# Altium footprint library main.PcbLib: 217 footprints (part 9 of 14)
Each footprint in its own frame and in the unit in brackets; x right, y up, seen from the top. Pads: shape width x height; smd on the part's side, far side on the other; paste and mask are expansions set on the pad; w line width, h text height; cw(c..) or ccw(c..) is an arc to the next point about the centre after c.
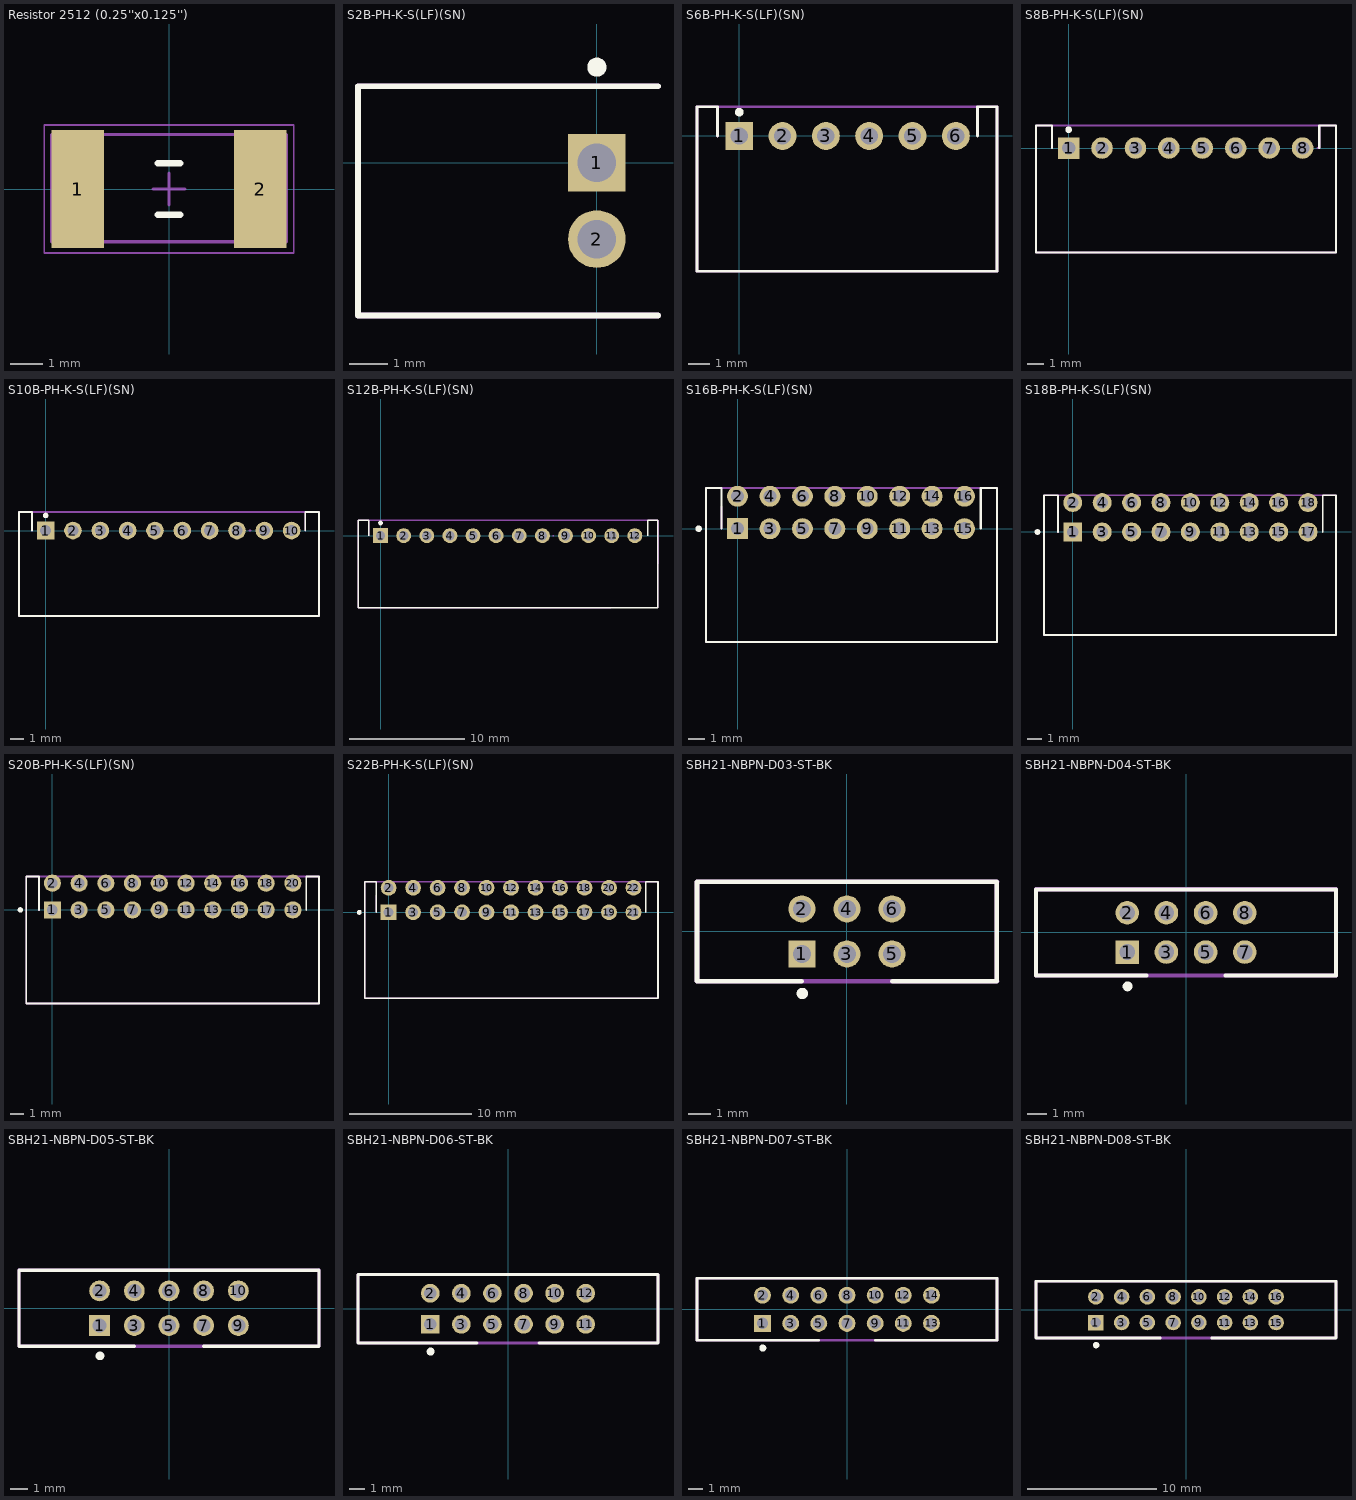
[diagram p8: the footprints below, top view; thin cyan lines are the x and y axes]

## Resistor 2512 (0.25''x0.125'') [mm] "Resistor 2512 (0.25''x0.125'')"
height 0.65
pads (2):
  rect 1.65x3.68 smd: 1(-2.85,0) 2(2.85,0)
Top Overlay:
  lines w0.2: -0.35,-0.8 0.35,-0.8 ; -0.35,0.8 0.35,0.8
Mechanical 7:
  text ".Designator" at -1.325,-0.454 h0.76
Mechanical 13:
  lines w0.1: -3.675,-1.65 3.675,-1.65 3.675,1.7 -3.675,1.7 -3.675,-1.65
Mechanical 15:
  lines w0.05: -3.9,-2 3.9,-2 3.9,2 -3.9,2 -3.9,-2
  lines w0.1: -0.5,0 0.5,0 ; 0,-0.5 0,0.5
3D body "User Library-R SMD 2512.STEP": height 0.82, standoff 0.22, extent -3.15,-1.55 3.15,1.6

## S2B-PH-K-S(LF)(SN) [mm]
pads (2):
  rect 1.508x1.508 hole 1: 1(0,0)
  round 1.508 hole 1: 2(0,-2)
Top Overlay:
  circle w0.25: c0,2.5 r0.125
  lines w0.152: 1.6,-4 -6.25,-4 -6.25,2 1.6,2
Mechanical 7:
  text ".Designator" at -5.5,-3.475 h1.52
Mechanical 15:
  lines w0.152: 1.6,-4 -6.25,-4 -6.25,2 1.6,2
3D body "S2B-PH-K-S.STEP": height 4.8, standoff -3.4, extent -6.25,-3.95 1.35,1.95

## S6B-PH-K-S(LF)(SN) [mm] "S6B-PH-K-S(LF)(SN)"
height 1.8
pads (6):
  rect 1.29x1.29 hole 0.8: 1(0,0)
  round 1.29 hole 0.8: 2(2,0) 3(4,0) 4(6,0) 5(8,0) 6(10,0)
Top Overlay:
  circle w0.2: c0,1.1 r0.1
  lines w0.127: -1,0 -1,1.35 -1.95,1.35 -1.95,-6.25 11.9,-6.25 11.9,1.35 11,1.35 11,0
Mechanical 7:
  text ".Designator" at -1.195,-4.27 h1.52
Mechanical 15:
  lines w0.127: -1,0 -1,1.35 -1.95,1.35 ; 11.9,0 11.9,1.35 -1.95,1.35 ; 11.9,1.25 11.9,-6.25 -1.95,-6.25 -1.95,1.35
3D body "S6B-PH-K-S.STEP": height 4.8, standoff -3.4, extent -2,-6.3 11.9,1.3

## S8B-PH-K-S(LF)(SN) [mm] "S8B-PH-K-S(LF)(SN)"
height 1.8
pads (8):
  rect 1.29x1.29 hole 0.8: 1(0,0)
  round 1.29 hole 0.8: 2(2,0) 3(4,0) 4(6,0) 5(8,0) 6(10,0) 7(12,0) 8(14,0)
Top Overlay:
  circle w0.2: c0,1.1 r0.1
  lines w0.127: -1,0 -1,1.35 -1.95,1.35 -1.95,-6.25 16,-6.25 16,1.35 15,1.35 15,0
Mechanical 7:
  text ".Designator" at -1.195,-4.27 h1.52
Mechanical 15:
  lines w0.127: -1,0 -1,1.35 -1.95,1.35 ; 14.9,0 15,0 15,1.35 16,1.35 ; -1.95,1.35 -1.95,-6.25 16,-6.25 16,1.35 ; -1.95,1.35 16,1.35
3D body "S8B-PH-K-S.STEP": height 4.8, standoff -3.4, extent -1.95,-6.25 15.95,1.35

## S10B-PH-K-S(LF)(SN) [mm] "S10B-PH-K-S(LF)(SN)"
height 1.8
pads (10):
  rect 1.29x1.29 hole 0.8: 1(0,0)
  round 1.29 hole 0.8: 2(2,0) 3(4,0) 4(6,0) 5(8,0) 6(10,0) 7(12,0) 8(14,0) 9(16,0) 10(18,0)
Top Overlay:
  circle w0.2: c0,1.1 r0.1
  lines w0.127: -1,0 -1,1.35 -1.95,1.35 -1.95,-6.25 19.94,-6.25 ; 19,0 19,1.35 20,1.35 20,-6.25
Mechanical 7:
  text ".Designator" at -1.195,-4.27 h1.52
Mechanical 15:
  lines w0.127: -1,0 -1,1.35 -1.95,1.35 ; 14.9,0 15,0 ; 18,1.35 19.93,1.35 ; 19,0 19,1.35 -1.95,1.35 ; 19.93,-6.25 -1.95,-6.25 -1.95,1.35 ; 20,-6.25 20,1.35
3D body "S10B-PH-K-S.STEP": height 4.8, standoff -3.4, extent -1.95,-6.24 19.95,1.36

## S12B-PH-K-S(LF)(SN) [mm] "S12B-PH-K-S(LF)(SN)"
height 1.8
pads (12):
  rect 1.29x1.29 hole 0.8: 1(0,0)
  round 1.29 hole 0.8: 2(2,0) 3(4,0) 4(6,0) 5(8,0) 6(10,0) 7(12,0) 8(14,0) 9(16,0) 10(18,0) 11(20,0) 12(22,0)
Top Overlay:
  circle w0.2: c0,1.1 r0.1
  lines w0.127: -1,0 -1,1.35 -1.95,1.35 -1.95,-6.25 24,-6.25 24,1.35 23.1,1.35 23.1,0
Mechanical 7:
  text ".Designator" at -1.195,-4.27 h1.52
Mechanical 15:
  lines w0.127: -1,0 -1,1.35 ; 14.9,0 15,0 ; 19.93,-6.25 -1.95,-6.25 -1.95,1.352 -1.944,1.346 24,1.346 24,0 ; 24,-6.248 24.003,1.346
3D body "S12B-PH-K-S.STEP": height 4.8, standoff -3.4, extent -1.948,-6.254 23.952,1.346

## S16B-PH-K-S(LF)(SN) [mm] "S16B-PH-K-S(LF)(SN)"
height 1.8
pads (16):
  rect 1.29x1.29 hole 0.8: 1(0,0)
  round 1.29 hole 0.8: 2(0,2) 3(2,0) 4(2,2) 5(4,0) 6(4,2) 7(6,0) 8(6,2) 9(8,0) 10(8,2) 11(10,0) 12(10,2) 13(12,0) 14(12,2) 15(14,0) 16(14,2)
Top Overlay:
  circle w0.2: c-2.4,0 r0.1
  lines w0.127: -1,0 -1,2.5 -1.95,2.5 -1.95,-7 16,-7 16,2.5 15,2.5 15,0
Mechanical 7:
  text ".Designator" at -1.195,-4.27 h1.52
Mechanical 15:
  lines w0.127: -1,0 -1,1.35 ; -1.95,-7 -1.95,2.5 16.001,2.5 15.997,-7 -1.95,-7
3D body "S16B-PHDSS.STEP": height 5, standoff -3, extent -1.95,-6.95 15.95,2.55

## S18B-PH-K-S(LF)(SN) [mm] "S18B-PH-K-S(LF)(SN)"
height 1.8
pads (18):
  rect 1.29x1.29 hole 0.8: 1(0,0)
  round 1.29 hole 0.8: 2(0,2) 3(2,0) 4(2,2) 5(4,0) 6(4,2) 7(6,0) 8(6,2) 9(8,0) 10(8,2) 11(10,0) 12(10,2) 13(12,0) 14(12,2) 15(14,0) 16(14,2) 17(16,0) 18(16,2)
Top Overlay:
  circle w0.2: c-2.4,0 r0.1
  lines w0.127: -1,0 -1,2.5 -1.95,2.5 -1.95,-7 17.9,-7 17.9,2.5 17,2.5 17,0
Mechanical 7:
  text ".Designator" at -1.195,-4.27 h1.52
Mechanical 15:
  lines w0.127: -1,0 -1,1.35 ; -1.95,-7 -1.95,2.5 17.902,2.5 17.898,-7 -1.95,-7
3D body "S18B-PHDSS.STEP": height 5, standoff -3, extent -2,-7 17.9,2.5

## S20B-PH-K-S(LF)(SN) [mm] "S20B-PH-K-S(LF)(SN)"
height 1.8
pads (20):
  rect 1.29x1.29 hole 0.8: 1(0,0)
  round 1.29 hole 0.8: 2(0,2) 3(2,0) 4(2,2) 5(4,0) 6(4,2) 7(6,0) 8(6,2) 9(8,0) 10(8,2) 11(10,0) 12(10,2) 13(12,0) 14(12,2) 15(14,0) 16(14,2) 17(16,0) 18(16,2) 19(18,0) 20(18,2)
Top Overlay:
  circle w0.2: c-2.4,0 r0.1
  lines w0.127: -1,0 -1,2.5 -1.95,2.5 -1.95,-7 19.95,-7 19.95,2.5 19,2.5 19,0
Mechanical 7:
  text ".Designator" at -1.195,-4.27 h1.52
Mechanical 15:
  lines w0.127: -1,0 -1,1.35 ; 19.93,-7 -1.95,-7 -1.95,2.5 19.95,2.5 ; 19.95,-7 19.954,2.5
3D body "S20B-PHDSS.STEP": height 5, standoff -3, extent -1.95,-7 19.95,2.5

## S22B-PH-K-S(LF)(SN) [mm] "S22B-PH-K-S(LF)(SN)"
height 1.8
pads (22):
  rect 1.29x1.29 hole 0.8: 1(0,0)
  round 1.29 hole 0.8: 2(0,2) 3(2,0) 4(2,2) 5(4,0) 6(4,2) 7(6,0) 8(6,2) 9(8,0) 10(8,2) 11(10,0) 12(10,2) 13(12,0) 14(12,2) 15(14,0) 16(14,2) 17(16,0) 18(16,2) 19(18,0) 20(18,2) 21(20,0) 22(20,2)
Top Overlay:
  circle w0.2: c-2.4,0 r0.1
  lines w0.127: -1,0 -1,2.5 -1.95,2.5 -1.95,-7 22,-7 22,2.5 21,2.5 21,0
Mechanical 7:
  text ".Designator" at -1.195,-4.27 h1.52
Mechanical 15:
  lines w0.127: -1,0 -1,1.35 ; -1.95,-7 21.998,-7 22.001,2.5 -1.95,2.5 -1.95,-7
3D body "S22B-PHDSS.STEP": height 5, standoff -3, extent -2,-7 21.9,2.5

## SBH21-NBPN-D03-ST-BK [mm] "SBH21-NBPN-D03-ST-BK"
height 5.4
pads (6):
  rect 1.2x1.2 hole 0.8 paste-1000 mask+0: 1(-2,-1)
  round 1.2 hole 0.8 paste-1000 mask+0: 2(-2,1) 3(0,-1) 4(0,1) 5(2,-1) 6(2,1)
Top Overlay:
  circle w0.25: c-1.98,-2.75 r0.125
  lines w0.2: -6.65,-2.2 -6.65,2.2 ; -6.645,-2.2 -2,-2.2 ; -6.645,2.2 6.645,2.2 ; 2,-2.2 6.645,-2.205 ; 6.65,-2.2 6.65,2.2
Mechanical 7:
  text ".Designator" at -3.94,-1.63 h1.52
Mechanical 13:
  lines w0.2: 6.65,-2.2 6.65,2.2 ; 6.655,-2.2 -6.65,-2.2 -6.65,2.2 6.655,2.2
Mechanical 15:
  lines w0.2: -6.65,-2.2 6.65,-2.2 6.65,2.205 -6.65,2.205 -6.65,-2.2
3D body: height 5.6, standoff 0, extent -6.65,-2.2 6.65,2.2

## SBH21-NBPN-D04-ST-BK [mm] "SBH21-NBPN-D04-ST-BK"
height 5.4
pads (8):
  rect 1.2x1.2 hole 0.8 paste-1000 mask+0: 1(-3,-1)
  round 1.2 hole 0.8 paste-1000 mask+0: 2(-3,1) 3(-1,-1) 4(-1,1) 5(1,-1) 6(1,1) 7(3,-1) 8(3,1)
Top Overlay:
  circle w0.25: c-2.98,-2.75 r0.125
  lines w0.2: -7.65,-2.2 -7.65,2.2 ; -7.645,-2.2 -2,-2.2 ; -7.645,2.2 7.645,2.2 ; 2,-2.2 7.645,-2.205 ; 7.65,-2.2 7.65,2.2
Mechanical 7:
  text ".Designator" at -4.94,-1.63 h1.52
Mechanical 13:
  lines w0.2: 5.655,-2.2 -7.65,-2.2 -7.65,2.2 7.65,2.2 7.65,-2.2
Mechanical 15:
  lines w0.2: -7.65,-2.2 7.65,-2.2 7.65,2.205 -7.65,2.205 -7.65,-2.2
3D body: height 5.6, standoff 0, extent -7.65,-2.2 7.65,2.2

## SBH21-NBPN-D05-ST-BK [mm] "SBH21-NBPN-D05-ST-BK"
height 5.4
pads (10):
  rect 1.2x1.2 hole 0.8 paste-1000 mask+0: 1(-4,-1)
  round 1.2 hole 0.8 paste-1000 mask+0: 2(-4,1) 3(-2,-1) 4(-2,1) 5(0,-1) 6(0,1) 7(2,-1) 8(2,1) 9(4,-1) 10(4,1)
Top Overlay:
  circle w0.25: c-3.98,-2.75 r0.125
  lines w0.2: -8.65,-2.2 -8.65,2.2 ; -8.645,-2.2 -2,-2.2 ; -8.645,2.2 8.65,2.2 8.65,-2.2 ; 2,-2.2 8.65,-2.205
Mechanical 7:
  text ".Designator" at -5.94,-1.63 h1.52
Mechanical 13:
  lines w0.2: 4.655,2.2 -8.65,2.2 -8.65,-2.2 8.65,-2.2 8.65,2.2
Mechanical 15:
  lines w0.2: -8.65,2.2 8.65,2.205 8.65,-2.2 -8.65,-2.2 -8.65,2.205
3D body: height 5.6, standoff 0, extent -8.65,-2.2 8.65,2.2

## SBH21-NBPN-D06-ST-BK [mm] "SBH21-NBPN-D06-ST-BK"
height 5.4
pads (12):
  rect 1.2x1.2 hole 0.8 paste-1000 mask+0: 1(-5,-1)
  round 1.2 hole 0.8 paste-1000 mask+0: 2(-5,1) 3(-3,-1) 4(-3,1) 5(-1,-1) 6(-1,1) 7(1,-1) 8(1,1) 9(3,-1) 10(3,1) 11(5,-1) 12(5,1)
Top Overlay:
  circle w0.25: c-4.98,-2.75 r0.125
  lines w0.2: -9.65,-2.2 -9.65,2.2 9.65,2.2 9.65,-2.2 2,-2.2 ; -9.645,-2.2 -2,-2.2
Mechanical 7:
  text ".Designator" at -6.94,-1.63 h1.52
Mechanical 13:
  lines w0.2: 3.655,2.2 -9.65,2.2 -9.65,-2.2 9.65,-2.2 9.65,2.2
Mechanical 15:
  lines w0.2: -9.65,2.2 9.65,2.206 9.65,-2.2 -9.65,-2.2 -9.65,2.205
3D body: height 5.6, standoff 0, extent -9.65,-2.2 9.65,2.2

## SBH21-NBPN-D07-ST-BK [mm] "SBH21-NBPN-D07-ST-BK"
height 5.4
pads (14):
  rect 1.2x1.2 hole 0.8 paste-1000 mask+0: 1(-6,-1)
  round 1.2 hole 0.8 paste-1000 mask+0: 2(-6,1) 3(-4,-1) 4(-4,1) 5(-2,-1) 6(-2,1) 7(0,-1) 8(0,1) 9(2,-1) 10(2,1) 11(4,-1) 12(4,1) 13(6,-1) 14(6,1)
Top Overlay:
  circle w0.25: c-5.98,-2.75 r0.125
  lines w0.2: -10.65,-2.2 -10.65,2.2 10.65,2.2 10.65,-2.2 2,-2.2 ; -10.645,-2.2 -2,-2.2
Mechanical 7:
  text ".Designator" at -7.94,-1.63 h1.52
Mechanical 13:
  lines w0.2: 2.655,2.2 -10.65,2.2 -10.65,-2.2 10.65,-2.2 10.65,2.2
Mechanical 15:
  lines w0.2: -10.65,2.2 10.65,2.206 10.65,-2.2 -10.65,-2.2 -10.65,2.205
3D body: height 5.6, standoff 0, extent -10.65,-2.2 10.65,2.2

## SBH21-NBPN-D08-ST-BK [mm] "SBH21-NBPN-D08-ST-BK"
height 5.4
pads (16):
  rect 1.2x1.2 hole 0.8 paste-1000 mask+0: 1(-7,-1)
  round 1.2 hole 0.8 paste-1000 mask+0: 2(-7,1) 3(-5,-1) 4(-5,1) 5(-3,-1) 6(-3,1) 7(-1,-1) 8(-1,1) 9(1,-1) 10(1,1) 11(3,-1) 12(3,1) 13(5,-1) 14(5,1) 15(7,-1) 16(7,1)
Top Overlay:
  circle w0.25: c-6.98,-2.75 r0.125
  lines w0.2: -11.65,-2.2 -11.65,2.2 11.65,2.2 11.65,-2.2 2,-2.2 ; -11.645,-2.2 -2,-2.2
Mechanical 7:
  text ".Designator" at -8.94,-1.63 h1.52
Mechanical 13:
  lines w0.2: 1.655,2.2 -11.65,2.2 -11.65,-2.2 11.65,-2.2 11.65,2.2
Mechanical 15:
  lines w0.2: -11.65,2.2 11.65,2.207 11.65,-2.2 -11.65,-2.2 -11.65,2.205
3D body: height 5.6, standoff 0, extent -11.65,-2.2 11.65,2.2